# Altium footprint library common_pcblib.PcbLib: 54 footprints (part 2 of 4)
Each footprint in its own frame and in the unit in brackets; x right, y up, seen from the top. Pads: shape width x height; smd on the part's side, far side on the other; paste and mask are expansions set on the pad; w line width, h text height; cw(c..) or ccw(c..) is an arc to the next point about the centre after c.
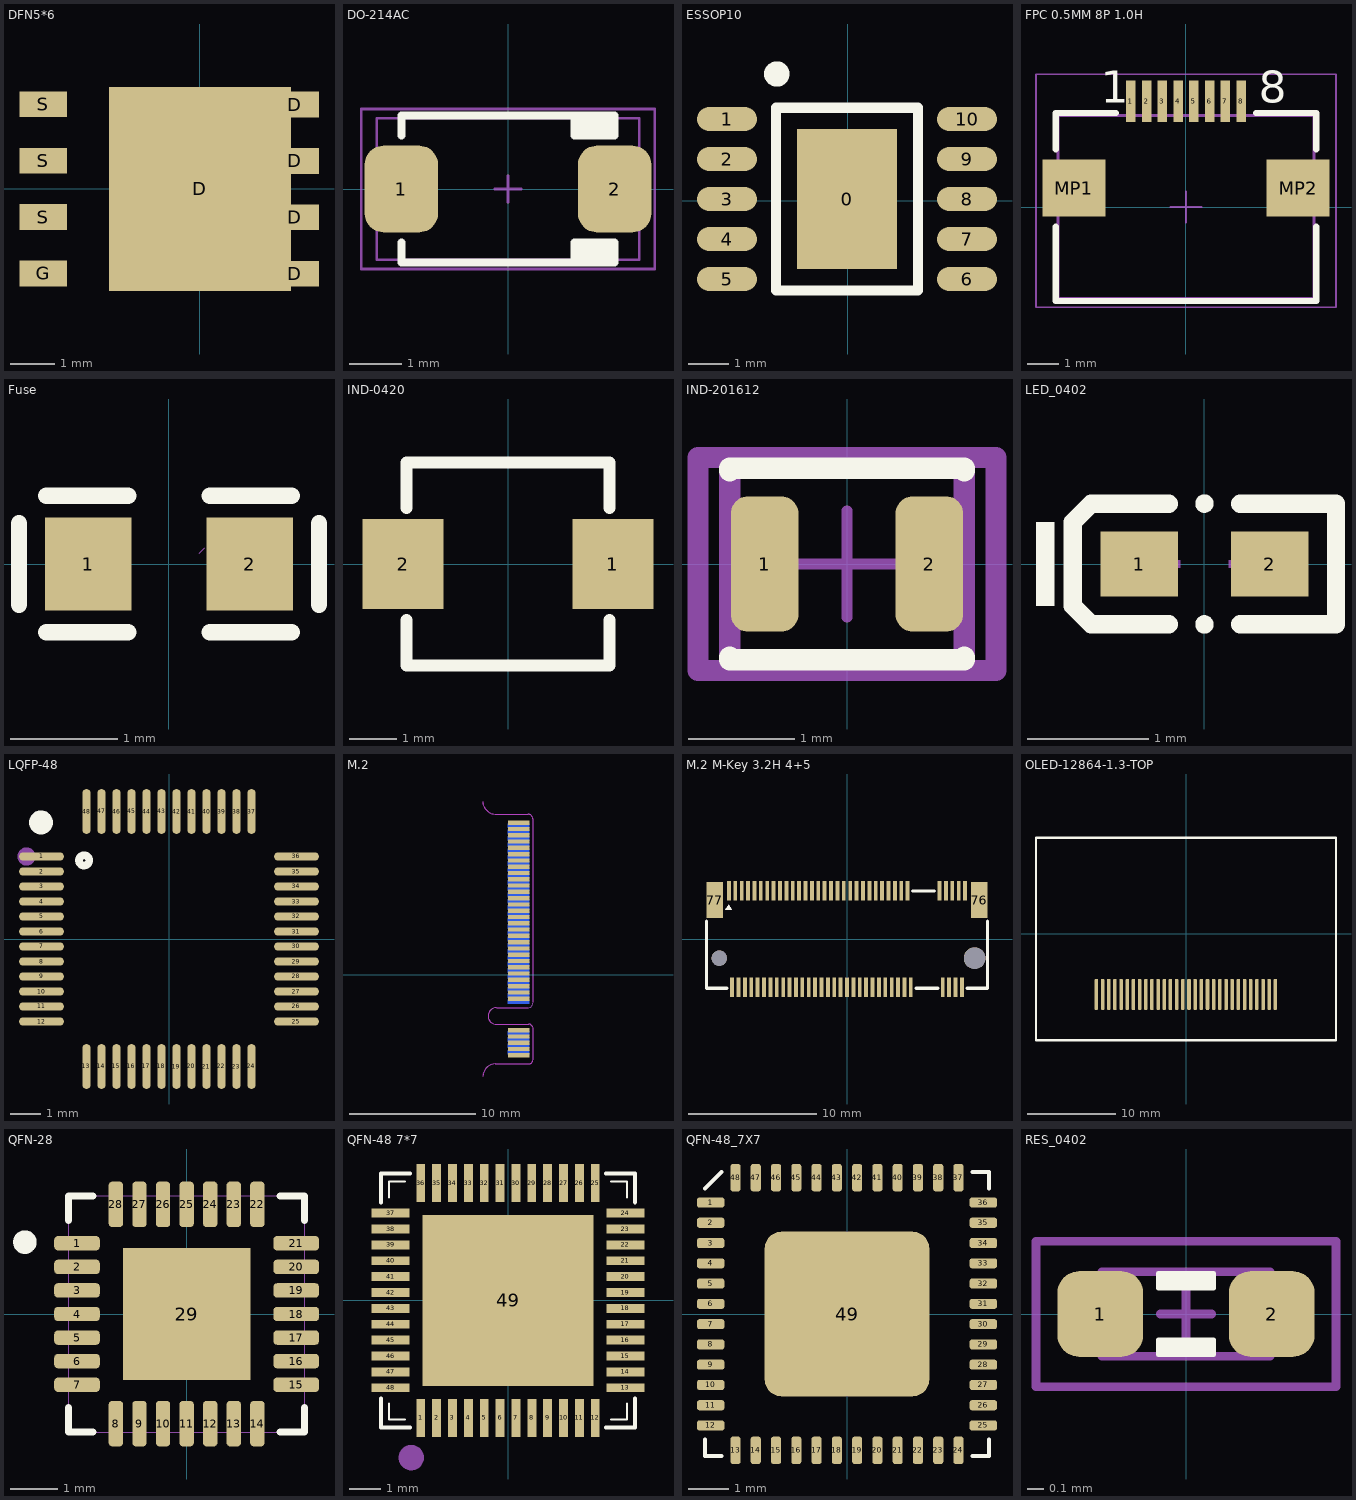
[diagram p1: the footprints below, top view; thin cyan lines are the x and y axes]

## DFN5*6 [mm]
pads (9):
  rect 4.1x4.6 smd: D(0,0)
  rect 1.08x0.58 smd: D(2.14,-1.91) D(2.14,-0.64) D(2.14,0.63) D(2.14,1.9)
  rect 1.079x0.58 smd: G(-3.53,-1.905) S(-3.53,-0.635) S(-3.53,0.635) S(-3.53,1.905)
Top Paste:
  region: -2.985,-1.61 -2.985,-2.2 -4.075,-2.2 -4.075,-1.61
  region: -2.985,-0.34 -2.985,-0.93 -4.075,-0.93 -4.075,-0.34
  region: -2.985,0.93 -2.985,0.34 -4.075,0.34 -4.075,0.93
  region: -2.985,2.2 -2.985,1.61 -4.075,1.61 -4.075,2.2
  region: 1.635,2.3 1.635,-2.3 -2.055,-2.3 -2.055,2.3
  region: 2.685,-1.61 2.685,-2.19 2.055,-2.19 2.055,-1.61
  region: 2.685,-0.35 2.685,-0.93 2.055,-0.93 2.055,-0.35
  region: 2.685,0.92 2.685,0.34 2.055,0.34 2.055,0.92
  region: 2.685,2.19 2.685,1.61 2.055,1.61 2.055,2.19
3D body "User Library-TDSON-8-1.step": height 1, standoff 0, extent -3.71,-2.675 2.44,2.675

## DO-214AC [mil]
pads (2):
  rrect50% 55x65 smd: 1(-80,0) 2(80,0)
Top Overlay:
  region: 50,-40 50,-55 80,-55 80,-40
  region: 50,40 50,55 80,55 80,40
  lines w6: -80,-40 -80,-55 80,-55 80,-40 50,-40 50,-55 ; -80,40 -80,55 80,55 80,40 50,40 50,55
Mechanical 13:
  lines w2: -10.01,-0.01 9.99,-0.01 ; -0.01,-10.01 -0.01,9.99 ; -98.44,-53.16 -98.44,53.14 98.41,53.14 98.41,-53.16 -98.44,-53.16
Mechanical 14:
  lines w2: -110,-60 110,-60 110,60 -110,60 -110,-60
3D body "User Library-DO-214AC_SMA.STEP": height 84.69, standoff -1.97, extent -98.43,-53.16 98.42,53.14

## ESSOP10 [mm] "CH224k"
pads (11):
  rect 2.5x3.5 smd: 0(-0.023,0.046)
  oval 1.5x0.6 smd: 1(-3.023,2.046) 2(-3.023,1.046) 3(-3.023,0.046) 4(-3.023,-0.954) 5(-3.023,-1.954) 6(2.977,-1.954) 7(2.977,-0.954) 8(2.977,0.046) 9(2.977,1.046) 10(2.977,2.046)
Top Overlay:
  circle w0.381: c-1.778,3.175 r0.127
  lines w0.254: -1.8,-2.24 1.756,-2.24 1.756,2.332 -1.8,2.332 -1.8,-2.24
Mechanical 15:
  lines w0.003: 0.358,0.554 0.359,0.554
3D body "User Library-ssop10.step": height 1.35, standoff -0.21, extent -3.022,-2.404 2.977,2.496

## FPC 0.5MM 8P 1.0H [mm] "FPC 连接器"
pads (10):
  rect 0.3x1.3 smd: 1(-1.75,3.35) 2(-1.25,3.35) 3(-0.75,3.35) 4(-0.25,3.35) 5(0.25,3.35) 6(0.75,3.35) 7(1.25,3.35) 8(1.75,3.35)
  rect 2x1.8 smd: MP1(-3.55,0.6) MP2(3.55,0.6)
Top Overlay:
  lines w0.2: -4.125,-0.625 -4.125,-2.975 4.125,-2.975 4.125,-0.625 ; -4.125,1.825 -4.125,2.975 -2.225,2.975 ; 2.225,2.975 4.125,2.975 4.125,1.825
  text "1" at -2.7,3.3 h1.02
  text "8" at 2.3,3.3 h1.02
Mechanical 13:
  lines w0.1: -4.05,-2.9 -4.05,2.9 4.05,2.9 4.05,-2.9 -4.05,-2.9
Mechanical 15:
  lines w0.05: -0.5,0 0.5,0 ; 0,-0.5 0,0.5 ; -4.75,-3.175 -4.75,4.2 4.75,4.2 4.75,-3.175 -4.75,-3.175
3D body "687108149022.stp": height 2.25, standoff 0, extent -4.05,-2.9 4.05,3.6

## Fuse [mm]
pads (2):
  rect 0.806x0.864 smd: 1(-0.753,0) 2(0.753,0)
Top Overlay:
  lines w0.152: -1.397,-0.381 -1.397,0.381 ; -1.143,-0.635 -0.381,-0.635 ; -1.143,0.635 -0.381,0.635 ; 0.381,-0.635 1.143,-0.635 ; 0.381,0.635 1.143,0.635 ; 1.397,-0.381 1.397,0.381
Top Paste:
  region: -0.315,-0.138 -0.315,0.138 -0.589,0.432 -1.092,0.432 -1.156,0.368 -1.156,-0.368 -1.092,-0.432 -0.589,-0.432
  region: 0.315,-0.138 0.315,0.138 0.589,0.432 1.092,0.432 1.156,0.368 1.156,-0.368 1.092,-0.432 0.589,-0.432
Mechanical 15:
  lines w0.003: 0.281,0.102 0.331,0.152
3D body "User Library-MF-FSMF020X_FUSE0603.step": height 0.53, standoff 0, extent -0.825,-0.425 0.825,0.425

## IND-0420 [mm] "0420功率电感"
pads (2):
  rect 1.724x1.92 smd: 1(2.228,0) 2(-2.228,0)
Top Overlay:
  lines w0.254: -2.159,-1.191 -2.159,-2.159 2.159,-2.159 2.159,-1.191 ; -2.159,1.27 -2.159,1.191 -2.159,2.159 2.159,2.159 2.159,1.191
3D body "User Library-l4x4.step": height 1, standoff -0.02, extent -2,-2 2,2

## IND-201612 [mm]
pads (2):
  rrect50% 0.635x1.27 smd paste+0 mask+0: 1(-0.774,0) 2(0.774,0)
Top Overlay:
  lines w0.2: -1.1,-0.875 -1.1,-0.9 1.1,-0.9 1.1,-0.875 ; -1.1,0.875 -1.1,0.9 1.1,0.9 1.1,0.875
Mechanical 10:
  lines w0.2: -1.4,-1 1.4,-1 1.4,1 -1.4,1 -1.4,-1
Mechanical 12:
  lines w0.2: -1.1,-0.9 1.1,-0.9 1.1,0.9 -1.1,0.9 -1.1,-0.9
Mechanical 15:
  lines w0.1: -0.5,0 0.5,0 ; 0,-0.5 0,0.5
  lines w0.2: -1.4,-1 1.4,-1 1.4,1 -1.4,1 -1.4,-1
3D body "Ind_Murata.step": height 0.95, standoff 0, extent -1,-0.8 1,0.8

## LED_0402 [mm]
pads (2):
  rect 0.636x0.54 smd: 1(-0.538,0) 2(0.538,0)
Top Overlay:
  circle w0.076: c0,-0.499 r0.038
  circle w0.076: c0,0.499 r0.038
  region: -1.237,-0.346 -1.237,0.346 -1.39,0.346 -1.39,-0.346
  lines w0.152: -0.296,-0.499 -0.933,-0.499 -1.085,-0.346 -1.085,0.346 -0.933,0.499 -0.296,0.499 ; 0.296,-0.499 1.085,-0.499 1.085,0.499 0.296,0.499
Top Paste:
  region: 0.198,-0.23 0.198,0.23 0.238,0.27 0.816,0.27 0.856,0.23 0.856,-0.23 0.816,-0.27 0.238,-0.27
  region: -0.198,-0.23 -0.198,0.23 -0.238,0.27 -0.816,0.27 -0.856,0.23 -0.856,-0.23 -0.816,-0.27 -0.238,-0.27
Mechanical 15:
  region: -0.44,-0.03 -0.44,0.03 -0.2,0.03 -0.2,-0.03
  region: 0.44,-0.03 0.44,0.03 0.2,0.03 0.2,-0.03
  region: 0.35,-0.2 0.35,0.2 0.29,0.2 0.29,-0.2
3D body "User Library-LED_1006_O.STEP": height 0.2, standoff 0, extent -0.5,-0.3 0.5,0.3

## LQFP-48 [mm]
pads (48):
  oval 1.5x0.27 smd: 1(-4.25,2.75) 2(-4.25,2.25) 3(-4.25,1.75) 4(-4.25,1.25) 5(-4.25,0.75) 6(-4.25,0.25) 7(-4.25,-0.25) 8(-4.25,-0.75) 9(-4.25,-1.25) 10(-4.25,-1.75) 11(-4.25,-2.25) 12(-4.25,-2.75) 25(4.25,-2.75) 26(4.25,-2.25) 27(4.25,-1.75) 28(4.25,-1.25) 29(4.25,-0.75) 30(4.25,-0.25) 31(4.25,0.25) 32(4.25,0.75) 33(4.25,1.25) 34(4.25,1.75) 35(4.25,2.25) 36(4.25,2.75)
  oval 0.27x1.5 smd: 13(-2.75,-4.25) 14(-2.25,-4.25) 15(-1.75,-4.25) 16(-1.25,-4.25) 17(-0.75,-4.25) 18(-0.25,-4.25) 19(0.25,-4.25) 20(0.75,-4.25) 21(1.25,-4.25) 22(1.75,-4.25) 23(2.25,-4.25) 24(2.75,-4.25) 37(2.75,4.25) 38(2.25,4.25) 39(1.75,4.25) 40(1.25,4.25) 41(0.75,4.25) 42(0.25,4.25) 43(-0.25,4.25) 44(-0.75,4.25) 45(-1.25,4.25) 46(-1.75,4.25) 47(-2.25,4.25) 48(-2.75,4.25)
Top Overlay:
  circle w0.254: c-2.83,2.62 r0.17
  lines w0.4: -4.067,3.885 cw(c-4.267,3.886) -4.067,3.887
Mechanical 15:
  circle w0.3: c-4.75,2.75 r0.15
3D body "LQFP48-7x7mm.step": height 1.6, standoff 0, extent -4.497,-4.497 4.497,4.497

## M.2 [mm]
pads (67):
  rect 1.7x0.34 smd: 1(14.416,12.087) 3(14.415,11.587) 5(14.415,11.086) 7(14.415,10.587) 9(14.415,10.086) 11(14.415,9.587) 13(14.415,9.086) 15(14.415,8.587) 17(14.415,8.086) 19(14.415,7.587) 21(14.415,7.086) 23(14.415,6.587) 25(14.415,6.086) 27(14.415,5.587) 29(14.415,5.086) 31(14.415,4.587) 33(14.415,4.086) 35(14.415,3.587) 37(14.415,3.086) 39(14.415,2.587) 41(14.415,2.086) 43(14.415,1.587) 45(14.415,1.086) 47(14.415,0.587) 49(14.415,0.086) 51(14.415,-0.413) 53(14.415,-0.914) 55(14.415,-1.413) 57(14.415,-1.914) 67(14.415,-4.413) 69(14.415,-4.914) 71(14.415,-5.413) 73(14.415,-5.914) 75(14.415,-6.413)
  rect 1.7x0.34 smd far side: 2(14.416,11.837) 4(14.415,11.338) 6(14.415,10.838) 8(14.415,10.338) 10(14.415,9.838) 12(14.415,9.338) 14(14.415,8.838) 16(14.415,8.338) 18(14.415,7.838) 20(14.415,7.336) 22(14.415,6.838) 24(14.415,6.338) 26(14.415,5.838) 28(14.415,5.338) 30(14.415,4.838) 32(14.415,4.338) 34(14.415,3.838) 36(14.415,3.338) 38(14.415,2.838) 40(14.415,2.338) 42(14.415,1.84) 44(14.415,1.338) 46(14.415,0.838) 48(14.415,0.338) 50(14.415,-0.162) 52(14.415,-0.662) 54(14.415,-1.162) 56(14.415,-1.662) 58(14.415,-2.162) 68(14.415,-4.662) 70(14.415,-5.162) 72(14.415,-5.662) 74(14.415,-6.162)
Keep-Out Layer:
  lines w0.025: 11.564,-8.093 cw(c12.564,-8.093) 12.564,-7.093 15.202,-7.098 ccw(c15.216,-6.758) 15.555,-6.719 ; 11.564,13.767 ccw(c12.564,13.767) 12.564,12.767 ; 11.566,-8.093 cw(c12.566,-8.093) 12.566,-7.093 15.203,-7.097 ccw(c15.218,-6.757) 15.556,-6.718 ; 11.566,13.767 ccw(c12.566,13.767) 12.566,12.767 15.178,12.777 ; 12.564,12.767 15.176,12.777 ; 15.151,-2.641 12.664,-2.643 ccw(c12.633,-3.293) 12.664,-3.943 15.227,-3.937 ; 15.151,12.777 cw(c15.13,12.35) 15.557,12.345 ; 15.152,-2.641 12.666,-2.643 ccw(c12.634,-3.293) 12.666,-3.943 15.228,-3.936 ; 15.152,12.777 cw(c15.131,12.35) 15.559,12.345 ; 15.211,-3.943 cw(c15.226,-4.283) 15.564,-4.323 15.557,-6.731 ; 15.213,-3.943 cw(c15.227,-4.283) 15.566,-4.322 15.559,-6.73 ; 15.557,-2.209 15.557,12.396 ; 15.559,-2.209 15.559,12.396
Mechanical 1:
  lines w0.025: 11.565,-8.095 cw(c12.565,-8.093) 12.563,-7.092 ; 11.565,13.766 ccw(c12.564,13.766) 12.566,12.767 15.176,12.777 ; 12.557,-7.093 15.202,-7.098 ccw(c15.216,-6.759) 15.555,-6.776 ; 15.176,12.774 cw(c15.13,12.35) 15.557,12.345 15.557,-2.21 ; 15.209,-3.939 cw(c15.223,-4.28) 15.562,-4.319 ; 15.211,-3.937 12.667,-3.942 cw(c12.635,-3.292) 12.636,-2.642 15.151,-2.642 ccw(c15.129,-2.216) 15.555,-2.21 ; 15.557,-6.762 15.564,-4.323

## M.2 M-Key 3.2H 4+5 [mm]
pads (71):
  rect 0.3x1.55 smd: 1(-9.25,3.775) 2(-9,-3.775) 3(-8.75,3.775) 4(-8.5,-3.775) 5(-8.25,3.775) 6(-8,-3.775) 7(-7.75,3.775) 8(-7.5,-3.775) 9(-7.25,3.775) 10(-7,-3.775) 11(-6.75,3.775) 12(-6.5,-3.775) 13(-6.25,3.775) 14(-6,-3.775) 15(-5.75,3.775) 16(-5.5,-3.775) 17(-5.25,3.775) 18(-5,-3.775) 19(-4.75,3.775) 20(-4.5,-3.775) 21(-4.25,3.775) 22(-4,-3.775) 23(-3.75,3.775) 24(-3.5,-3.775) 25(-3.25,3.775) 26(-3,-3.775) 27(-2.75,3.775) 28(-2.5,-3.775) 29(-2.25,3.775) 30(-2,-3.775) 31(-1.75,3.775) 32(-1.5,-3.775) 33(-1.25,3.775) 34(-1,-3.775) 35(-0.75,3.775) 36(-0.5,-3.775) 37(-0.25,3.775) 38(0,-3.775) 39(0.25,3.775) 40(0.5,-3.775) 41(0.75,3.775) 42(1,-3.775) 43(1.25,3.775) 44(1.5,-3.775) 45(1.75,3.775) 46(2,-3.775) 47(2.25,3.775) 48(2.5,-3.775) 49(2.75,3.775) 50(3,-3.775) 51(3.25,3.775) 52(3.5,-3.775) 53(3.75,3.775) 54(4,-3.775) 55(4.25,3.775) 56(4.5,-3.775) 57(4.75,3.775) 58(5,-3.775) 67(7.25,3.775) 68(7.5,-3.775) 69(7.75,3.775) 70(8,-3.775) 71(8.25,3.775) 72(8.5,-3.775) 73(8.75,3.775) 74(9,-3.775) 75(9.25,3.775)
  rect 1.3x2.8 smd: 76(10.35,3.05) 77(-10.35,3.05)
  round 1.2 hole 1.2 unplated: ""(-10,-1.5)
  round 1.7 hole 1.7 unplated: ""(10,-1.5)
Top Overlay:
  region: -9.271,2.667 -9.525,2.286 -9.017,2.286
  lines w0.254: -11,-3.176 -11,-0.5 -11,1 -11,1.419 ; -11,-2.5 -11,-3.85 -9.396,-3.85 ; 5.146,3.75 6.854,3.75 ; 5.396,-3.85 7.104,-3.85 ; 9.396,-3.85 11,-3.85 11,-2.5 ; 11,-2.724 11,-0.5 11,1 11,1.419
Mechanical 15:
  region: -9.271,2.667 -9.525,2.286 -9.017,2.286
3D body "Conn_TE_1-2199230-6_eec.STEP": height 0.25, standoff 0, extent -11.1,-4.652 11.1,4.648

## OLED-12864-1.3-TOP [mm]
pads (30):
  rrect50% 0.4x3.5 smd: 1(-10.16,-6.858) 2(-9.46,-6.858) 3(-8.76,-6.858) 4(-8.06,-6.858) 5(-7.36,-6.858) 6(-6.66,-6.858) 7(-5.96,-6.858) 8(-5.26,-6.858) 9(-4.56,-6.858) 10(-3.86,-6.858) 11(-3.16,-6.858) 12(-2.46,-6.858) 13(-1.76,-6.858) 14(-1.06,-6.858) 15(-0.36,-6.858) 16(0.34,-6.858) 17(1.04,-6.858) 18(1.74,-6.858) 19(2.44,-6.858) 20(3.14,-6.858) 21(3.84,-6.858) 22(4.54,-6.858) 23(5.24,-6.858) 24(5.94,-6.858) 25(6.64,-6.858) 26(7.34,-6.858) 27(8.04,-6.858) 28(8.74,-6.858) 29(9.44,-6.858) 30(10.14,-6.858)
Top Overlay:
  lines w0.254: -17.018,-12.065 17.018,-12.065 17.018,10.922 -17.018,10.922 -17.018,-12.065
3D body "Oled SH1106-fix.step": height 4.6, standoff 2.26, extent -17,-14.29 17,11.073

## QFN-28 [mil]
pads (29):
  rrect50% 38x12 smd mask+5: 1(-91.5,59.06) 2(-91.5,39.37) 3(-91.5,19.68) 4(-91.5,0) 5(-91.5,-19.68) 6(-91.5,-39.37) 7(-91.5,-59.06) 15(91.5,-59.06) 16(91.5,-39.37) 17(91.5,-19.68) 18(91.5,0) 19(91.5,19.68) 20(91.5,39.37) 21(91.5,59.06)
  rrect50% 12x38 smd mask+5: 8(-59.06,-91.5) 9(-39.37,-91.5) 10(-19.68,-91.5) 11(0,-91.5) 12(19.68,-91.5) 13(39.37,-91.5) 14(59.06,-91.5) 22(59.06,91.5) 23(39.37,91.5) 24(19.68,91.5) 25(0,91.5) 26(-19.68,91.5) 27(-39.37,91.5) 28(-59.06,91.5)
  rect 106.3x110.24 smd: 29(0,0)
Top Overlay:
  circle w9.84: c-135,60 r4.92
  lines w6: -98.5,-78.16 -98.5,-98.5 -78.16,-98.5 ; -98.5,78.16 -98.5,98.5 -78.16,98.5 ; 78.16,-98.5 98.5,-98.5 98.5,-78.16 ; 78.16,98.5 98.5,98.5 98.5,78.16
Mechanical 1:
  lines w0: -98.5,-98.5 98.5,-98.5 98.5,98.5 -98.5,98.5 -98.5,-98.5 ; -98.5,-65.06 -98.5,-53.06 -98.5,-65.06 ; -98.5,-45.37 -98.5,-33.37 -98.5,-45.37 ; -98.5,-25.68 -98.5,-13.69 -98.5,-25.68 ; -98.5,-6 -98.5,6 -98.5,-6 ; -98.5,13.69 -98.5,25.68 -98.5,13.69 ; -98.5,33.37 -98.5,45.37 -98.5,33.37 ; -98.5,53.06 -98.5,65.06 -98.5,53.06 ; -65.06,-98.5 -53.06,-98.5 -65.06,-98.5 ; -65.06,98.5 -53.06,98.5 -65.06,98.5 ; -45.37,-98.5 -33.37,-98.5 -45.37,-98.5 ; -45.37,98.5 -33.37,98.5 -45.37,98.5 ; -25.68,-98.5 -13.69,-98.5 -25.68,-98.5 ; -25.68,98.5 -13.69,98.5 -25.68,98.5 ; -6,-98.5 6,-98.5 -6,-98.5 ; -6,98.5 6,98.5 -6,98.5 ; 13.69,-98.5 25.68,-98.5 13.69,-98.5 ; 13.69,98.5 25.68,98.5 13.69,98.5 ; 33.37,-98.5 45.37,-98.5 33.37,-98.5 ; 33.37,98.5 45.37,98.5 33.37,98.5 ; 53.06,-98.5 65.06,-98.5 53.06,-98.5 ; 53.06,98.5 65.06,98.5 53.06,98.5 ; 98.5,-65.06 98.5,-53.06 98.5,-65.06 ; 98.5,-45.37 98.5,-33.37 98.5,-45.37 ; 98.5,-25.68 98.5,-13.69 98.5,-25.68 ; 98.5,-6 98.5,6 98.5,-6 ; 98.5,13.69 98.5,25.68 98.5,13.69 ; 98.5,33.37 98.5,45.37 98.5,33.37 ; 98.5,53.06 98.5,65.06 98.5,53.06
3D body "321.stp": height 35.43, standoff 0, extent -98.5,-98.5 98.35,98.35

## QFN-48 7*7 [mm] "ESP32-PICO-D4"
pads (49):
  rect 0.28x1.2 smd: 1(-2.75,-3.7) 2(-2.25,-3.7) 3(-1.75,-3.7) 4(-1.25,-3.7) 5(-0.75,-3.7) 6(-0.25,-3.7) 7(0.25,-3.7) 8(0.75,-3.7) 9(1.25,-3.7) 10(1.75,-3.7) 11(2.25,-3.7) 12(2.75,-3.7) 25(2.75,3.7) 26(2.25,3.7) 27(1.75,3.7) 28(1.25,3.7) 29(0.75,3.7) 30(0.25,3.7) 31(-0.25,3.7) 32(-0.75,3.7) 33(-1.25,3.7) 34(-1.75,3.7) 35(-2.25,3.7) 36(-2.75,3.7)
  rect 1.2x0.28 smd: 13(3.7,-2.75) 14(3.7,-2.25) 15(3.7,-1.75) 16(3.7,-1.25) 17(3.7,-0.75) 18(3.7,-0.25) 19(3.7,0.25) 20(3.7,0.75) 21(3.7,1.25) 22(3.7,1.75) 23(3.7,2.25) 24(3.7,2.75) 37(-3.7,2.75) 38(-3.7,2.25) 39(-3.7,1.75) 40(-3.7,1.25) 41(-3.7,0.75) 42(-3.7,0.25) 43(-3.7,-0.25) 44(-3.7,-0.75) 45(-3.7,-1.25) 46(-3.7,-1.75) 47(-3.7,-2.25) 48(-3.7,-2.75)
  rect 5.4x5.4 smd: 49(0,0)
Top Overlay:
  lines w0.064: -3.75,-3.25 -3.75,-3.75 -3.25,-3.75 ; -3.75,3.25 -3.75,3.75 -3.25,3.75 ; 3.25,-3.75 3.75,-3.75 3.75,-3.25 ; 3.25,3.75 3.75,3.75 3.75,3.25
  lines w0.127: -4,-3.095 -4,-4 -3.084,-4 ; -4,3.085 -4,4 -3.095,4 ; 3.085,4 4,4 4,3.095 ; 3.095,-4 4,-4 4,-3.084
Mechanical 15:
  circle w0.4: c-3.048,-4.953 r0.2
3D body "User Library-QFN48-2.step": height 0.9, standoff 0, extent -3.525,-3.525 3.525,3.525

## QFN-48_7X7 [mm]
pads (49):
  rrect50% 0.675x0.25 smd: 1(-3.363,2.75) 2(-3.363,2.25) 3(-3.363,1.75) 4(-3.363,1.25) 5(-3.363,0.75) 6(-3.363,0.25) 7(-3.363,-0.25) 8(-3.363,-0.75) 9(-3.363,-1.25) 10(-3.363,-1.75) 11(-3.363,-2.25) 12(-3.363,-2.75) 25(3.363,-2.75) 26(3.363,-2.25) 27(3.363,-1.75) 28(3.363,-1.25) 29(3.363,-0.75) 30(3.363,-0.25) 31(3.363,0.25) 32(3.363,0.75) 33(3.363,1.25) 34(3.363,1.75) 35(3.363,2.25) 36(3.363,2.75)
  rrect50% 0.25x0.675 smd: 13(-2.75,-3.363) 14(-2.25,-3.363) 15(-1.75,-3.363) 16(-1.25,-3.363) 17(-0.75,-3.363) 18(-0.25,-3.363) 19(0.25,-3.363) 20(0.75,-3.363) 21(1.25,-3.363) 22(1.75,-3.363) 23(2.25,-3.363) 24(2.75,-3.363) 37(2.75,3.363) 38(2.25,3.363) 39(1.75,3.363) 40(1.25,3.363) 41(0.75,3.363) 42(0.25,3.363) 43(-0.25,3.363) 44(-0.75,3.363) 45(-1.25,3.363) 46(-1.75,3.363) 47(-2.25,3.363) 48(-2.75,3.363)
  rrect20% 4.064x4.064 smd: 49(0,0)
Top Overlay:
  lines w0.1: -3.5,-3.1 -3.5,-3.5 -3.1,-3.5 ; -3.5,3.1 -3.1,3.5 ; 3.1,-3.5 3.5,-3.5 3.5,-3.1 ; 3.1,3.5 3.5,3.5 3.5,3.1
3D body: height 1, standoff 0.05, extent -3.5,-3.5 3.5,3.5

## RES_0402 [mil]
pads (2):
  rrect50% 20x20 smd mask+0: 1(-20,0) 2(20,0)
Top Overlay:
  region: 6.5,-9.5 -6.5,-9.5 -6.5,-6 6.5,-6
  region: -6.5,9.5 6.5,9.5 6.5,6 -6.5,6
  lines w1: -6.5,-9.5 6.5,-9.5 6.5,-6 -6.5,-6 -6.5,-9.5 ; -6.5,6 -6.5,9.5 6.5,9.5 6.5,6 -6.5,6
Mechanical 13:
  lines w2: -6,0 6,0 ; 0,-6 0,6 ; -19.69,-9.84 -19.69,9.84 19.68,9.84 19.68,-9.84 -19.69,-9.84
Mechanical 14:
  lines w2: -35,-17 35,-17 35,17 -35,17 -35,-17
3D body "User Library-User Library-RES0402-2.step": height 13.78, standoff 0, extent -19.69,-9.84 19.69,9.85